# Altium footprint library SMD Component.PcbLib: 163 footprints (part 6 of 11)
Each footprint in its own frame and in the unit in brackets; x right, y up, seen from the top. Pads: shape width x height; smd on the part's side, far side on the other; paste and mask are expansions set on the pad; w line width, h text height; cw(c..) or ccw(c..) is an arc to the next point about the centre after c.
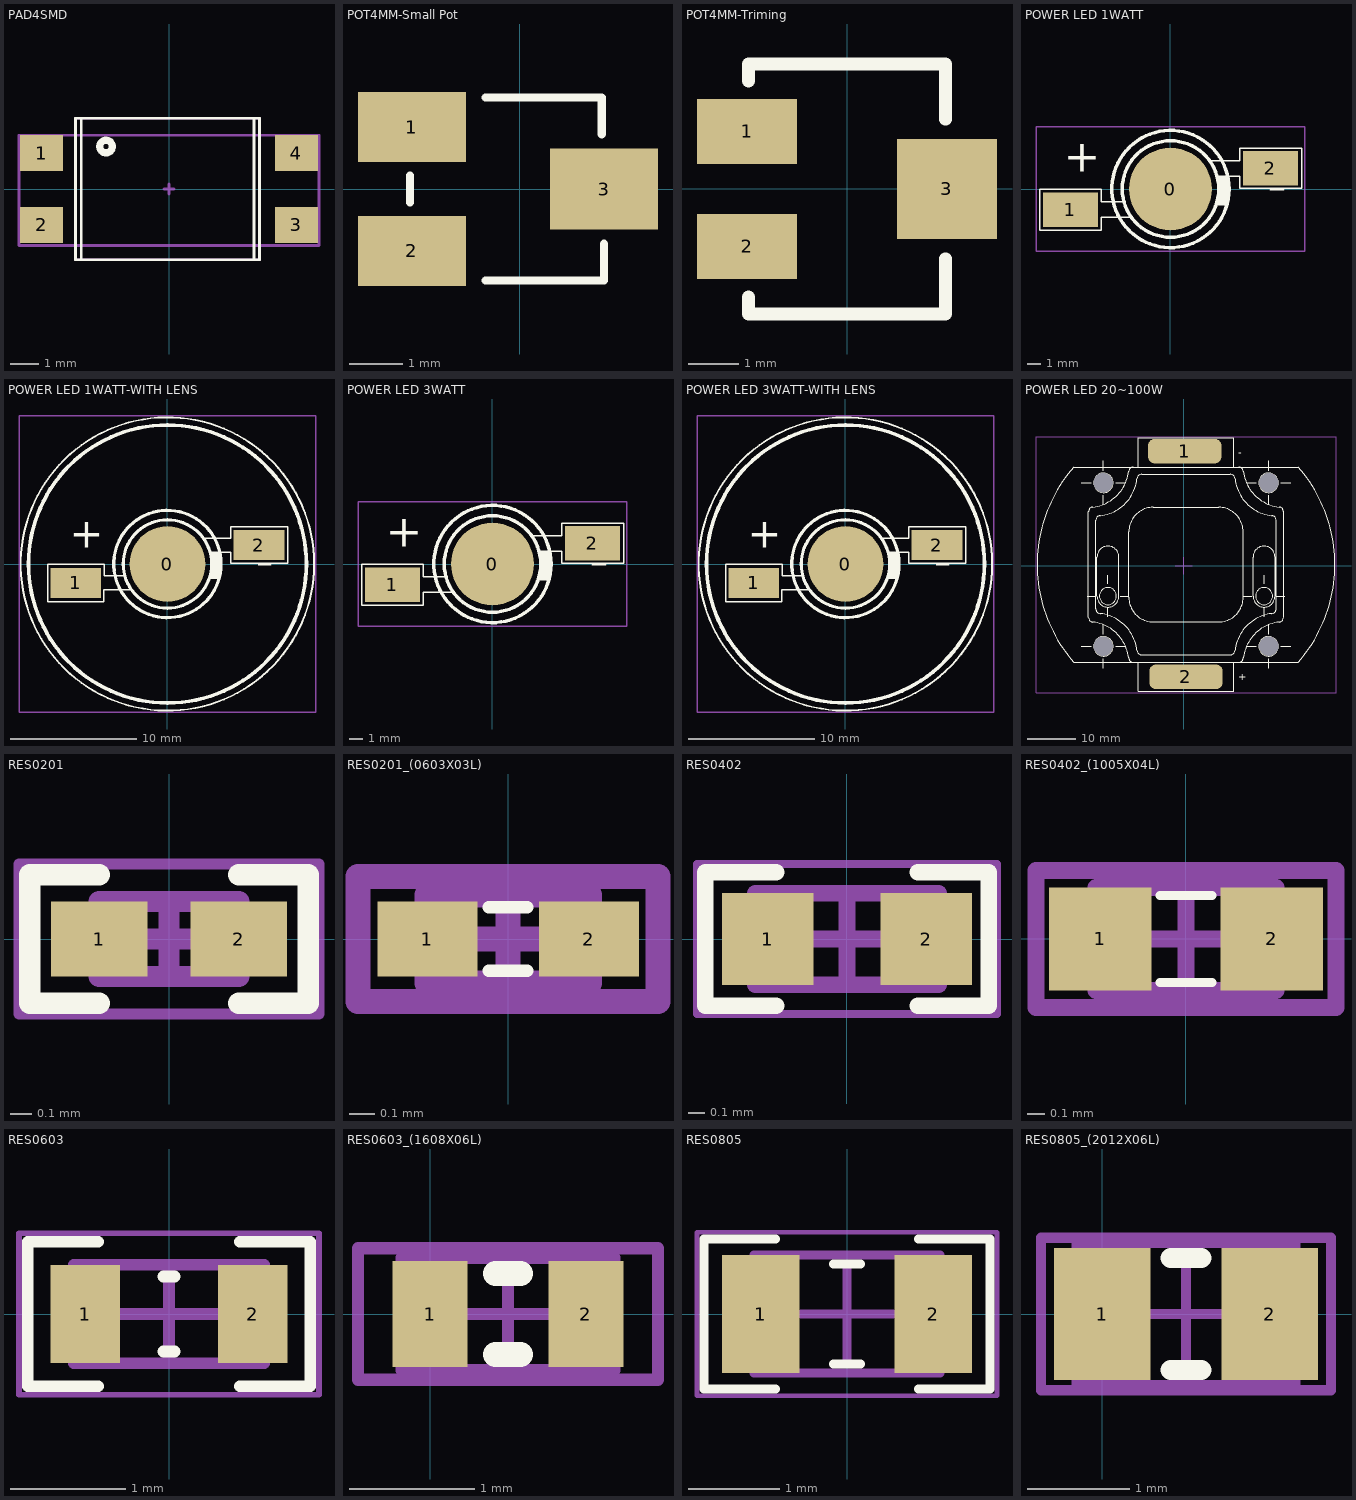
[diagram p5: the footprints below, top view; thin cyan lines are the x and y axes]

## PAD4SMD [mm]
pads (4):
  rect 1.524x1.27 smd: 1(-4.5,1.27) 2(-4.5,-1.27) 3(4.5,-1.27) 4(4.5,1.27)
Top Overlay:
  circle w0.254: c-2.224,1.5 r0.224
  lines w0.1: -3.1,-2.5 -3.1,2.5 ; 3,-2.5 3,2.5 ; -3.3,-2.5 -3.3,2.5 3.2,2.5 3.2,-2.5 -3.3,-2.5
Mechanical 13:
  lines w0.1: -3.3,2.5 -3.3,-2.5 3.2,-2.5 3.2,2.5 -3.25,2.5
Mechanical 15:
  lines w0.1: -0.175,0 0.175,0 ; 0,-0.175 0,0.175 ; -5.3,-2 5.3,-2 5.3,1.9 -5.3,1.9 -5.3,-2
3D body: height 0.55, standoff 0, extent -3.3,-2.5 3.2,2.5

## POT4MM-Small Pot [mm] "Square Trimming Potentiometer"
pads (3):
  rect 2x1.3 smd: 1(-2,1.15) 2(-2,-1.15)
  rect 2x1.5 smd: 3(1.568,0)
Top Overlay:
  lines w0.15: -2.032,-0.254 -2.032,0.254 ; -0.635,-1.7 1.568,-1.7 1.568,-1.016 ; -0.635,1.7 1.524,1.7 1.524,1.016
3D body "TRIMMER_PVG3A.STEP": height 2, standoff 0, extent -2.032,-1.7 1.568,1.7

## POT4MM-Triming [mm] "Square Trimming Potentiometer"
pads (3):
  rect 2x1.3 smd: 1(-2,1.15) 2(-2,-1.15)
  rect 2x2 smd: 3(2,0)
Top Overlay:
  lines w0.254: -1.97,-2.159 -1.97,-2.5 1.97,-2.5 1.97,-1.397 ; -1.97,2.159 -1.97,2.5 1.97,2.5 1.97,1.397
3D body "SW3dPS-Pot 3214.STEP": height 5.4, standoff 0, extent -1.97,-2.4 1.97,2.4

## POWER LED 1WATT [mm] "DESIGNER : ABBAS BASEREH"
height 6
pads (3):
  round 6 smd: 0(0,0)
  rect 4x2.5 smd: 1(-7.25,-1.5) 2(7.25,1.5)
Top Overlay:
  circle w0.254: c0,0 r4.25
  circle w0.254: c0,0 r3.5
  rectangle: 3.405,-1.185 4.185,0.93
  lines w0.1: -3.315,-0.915 -5.01,-0.915 -5.01,-0.015 -9.465,-0.015 -9.465,-1.335 -9.465,-2.985 -5.025,-2.985 -5.025,-2.055 -2.88,-2.055 ; 2.64,2.31 2.91,2.04 5.01,2.04 5.01,2.94 9.06,2.94 9.51,2.94 9.51,0.72 9.51,0.06 5.01,0.06 5.01,0.93 3.45,0.93 3.45,0.675
  text "-" at 7,-2 h5
  text "+" at -7.75,0.5 h4
Mechanical 15:
  lines w0.1: -0.5,0 0.5,0 ; 0,-0.5 0,0.5 ; -9.75,-4.5 9.75,-4.5 9.75,4.5 -9.75,4.5 -9.75,-4.5
3D body "SW3dPS-Power LED2.STEP": height 5.55, standoff 0, extent -7.25,-4 7.25,4

## POWER LED 1WATT-WITH LENS [mm] "DESIGNER : ABBAS BASEREH"
height 13
pads (3):
  round 6 smd: 0(0,0)
  rect 4x2.4 smd: 1(-7.25,-1.5) 2(7.25,1.5)
Top Overlay:
  circle w0.15: c0,0 r11.613
  circle w0.254: c0,0 r4.25
  circle w0.254: c0,0 r3.5
  circle w0.3: c0,0 r11
  rectangle: 3.405,-1.185 4.185,0.93
  lines w0.1: -3.315,-0.915 -5.01,-0.915 -5.01,-0.015 -9.465,-0.015 -9.465,-1.335 -9.465,-2.985 -5.025,-2.985 -5.025,-2.055 -2.88,-2.055 ; 2.64,2.31 2.91,2.04 5.01,2.04 5.01,2.94 9.06,2.94 9.51,2.94 9.51,0.72 9.51,0.06 5.01,0.06 5.01,0.93 3.45,0.93 3.45,0.675
  text "-" at 7,-2 h5
  text "+" at -7.75,0.5 h4
Mechanical 15:
  lines w0.1: -0.75,0 0.75,0 ; 0,-0.75 0,0.75 ; -11.75,-11.75 11.75,-11.75 11.75,11.75 -11.75,11.75 -11.75,-11.75
3D body: height 13, standoff 0, extent -11,-11 11,11.1
3D body "User Library-FL-36.STEP": height 14, standoff -0.15, extent -9.697,-9.75 9.697,9.85
3D body "SW3dPS-Power LED2.STEP": height 5.55, standoff 0, extent -7.25,-4 7.25,4

## POWER LED 3WATT [mm] "DESIGNER : ABBAS BASEREH"
height 6
pads (3):
  round 6 smd: 0(0,0)
  rect 4x2.5 smd: 1(-7.25,-1.5) 2(7.25,1.5)
Top Overlay:
  circle w0.254: c0,0 r3.5
  circle w0.254: c0,0 r4.25
  rectangle: 3.405,-1.185 4.185,0.93
  lines w0.1: -3.315,-0.915 -5.01,-0.915 -5.01,-0.015 -9.465,-0.015 -9.465,-1.335 -9.465,-2.985 -5.025,-2.985 -5.025,-2.055 -2.88,-2.055 ; 2.64,2.31 2.91,2.04 5.01,2.04 5.01,2.94 9.06,2.94 9.51,2.94 9.51,0.72 9.51,0.06 5.01,0.06 5.01,0.93 3.45,0.93 3.45,0.675
  text "+" at -7.75,0.5 h4
  text "-" at 7,-2 h5
Mechanical 15:
  lines w0.1: -0.5,0 0.5,0 ; 0,-0.5 0,0.5 ; -9.75,-4.5 -9.75,4.5 9.75,4.5 9.75,-4.5 -9.75,-4.5
3D body "User Library-zled_p4-1.STEP": height 5.2, standoff 0, extent -7.25,-4 7.25,4

## POWER LED 3WATT-WITH LENS [mm] "DESIGNER : ABBAS BASEREH"
height 13
pads (3):
  round 6 smd: 0(0,0)
  rect 4x2.4 smd: 1(-7.25,-1.5) 2(7.25,1.5)
Top Overlay:
  circle w0.3: c0,0 r11
  circle w0.254: c0,0 r3.5
  circle w0.254: c0,0 r4.25
  circle w0.15: c0,0 r11.613
  rectangle: 3.405,-1.185 4.185,0.93
  lines w0.1: -3.315,-0.915 -5.01,-0.915 -5.01,-0.015 -9.465,-0.015 -9.465,-1.335 -9.465,-2.985 -5.025,-2.985 -5.025,-2.055 -2.88,-2.055 ; 2.64,2.31 2.91,2.04 5.01,2.04 5.01,2.94 9.06,2.94 9.51,2.94 9.51,0.72 9.51,0.06 5.01,0.06 5.01,0.93 3.45,0.93 3.45,0.675
  text "+" at -7.75,0.5 h4
  text "-" at 7,-2 h5
Mechanical 15:
  lines w0.1: -0.75,0 0.75,0 ; 0,-0.75 0,0.75 ; -11.75,-11.75 -11.75,11.75 11.75,11.75 11.75,-11.75 -11.75,-11.75
3D body "User Library-zled_p4-1.STEP": height 5.2, standoff 0, extent -7.25,-4 7.25,4
3D body "User Library-FL-36.STEP": height 14, standoff -0.15, extent -9.697,-9.75 9.697,9.85
3D body: height 13, standoff 0, extent -11,-11 11,11.1

## POWER LED 20~100W [mm] "DESIGNER ABBAS BASEREH"
height 5
pads (6):
  rrect50% 15x5 smd: 1(0.25,23.5) 2(0.5,-22.75)
  round 4 hole 4: SCREW(-16.431,-16.508) SCREW(-16.431,17.008) SCREW(17.431,-16.508) SCREW(17.431,17.008)
Top Overlay:
  circle w0.013: c16.5,-6.197 r1.75
  circle w0.013: c-15.5,-6.197 r1.75
  circle w0.013: c-4.442,23.25 r1
  circle w0.013: c0.5,23.25 r1
  circle w0.013: c5.558,23.25 r1
  circle w0.013: c0.5,-22.75 r1
  circle w0.013: c5.5,-22.75 r1
  circle w0.013: c-4.5,-22.75 r1
  circle w0.013: c17.431,17.008 r2
  circle w0.013: c17.431,-16.508 r2
  circle w0.013: c-16.431,17.008 r2
  circle w0.013: c-16.431,-16.508 r2
  lines w0.013: -20.931,-16.508 -18.931,-16.508 ; -20.931,17.008 -18.931,17.008 ; -19.75,-6.197 -18,-6.197 ; -16.431,-21.008 -16.431,-19.008 ; -16.431,-14.008 -16.431,-12.008 ; -16.431,12.508 -16.431,14.508 ; -16.431,19.508 -16.431,21.508 ; -15.5,-10.447 -15.5,-8.697 ; -15.5,-3.697 -15.5,-1.947 ; -13.931,-16.508 -11.931,-16.508 ; -13.931,17.008 -11.931,17.008 ; -13,-6.197 -11.25,-6.197 ; -9.275,-19.75 -9.275,-25.75 10.275,-25.75 10.275,-19.75 ; -9.275,20.25 -9.275,26.25 10.275,26.25 10.275,20.25 ; 12.25,-6.197 14,-6.197 ; 12.931,-16.508 14.931,-16.508 ; 12.931,17.008 14.931,17.008 ; 16.5,-10.447 16.5,-8.697 ; 16.5,-3.697 16.5,-1.947 ; 17.431,-21.008 17.431,-19.008 ; 17.431,-14.008 17.431,-12.008 ; 17.431,12.508 17.431,14.508 ; 17.431,19.508 17.431,21.508 ; 19,-6.197 20.75,-6.197 ; 19.931,-16.508 21.931,-16.508 ; 19.931,17.008 21.931,17.008 ; -10.275,-19.75 cw(c-10.275,-18.75) -11.269,-18.861 ccw(c-19.5,-19.777) -18.608,-11.544 cw(c-18.5,-10.549) -19.5,-10.549 -19.5,11.049 cw(c-18.5,11.049) -18.608,12.044 ccw(c-19.5,20.277) -11.269,19.361 cw(c-10.275,19.25) -10.275,20.25 ; -10.275,-19.75 11.275,-19.75 ; -10.275,-19.75 -22.535,-19.75 cw(c0.5,0.25) -22.535,20.25 -10.275,20.25 ; -10.275,20.25 11.275,20.25 ; 11.275,-19.75 ccw(c11.275,-18.75) 12.269,-18.861 cw(c20.5,-19.777) 19.608,-11.544 ccw(c19.5,-10.549) 20.5,-10.549 20.5,11.049 ccw(c19.5,11.049) 19.608,12.044 cw(c20.5,20.277) 12.269,19.361 ccw(c11.275,19.25) 11.275,20.25 ; 11.275,-19.75 23.535,-19.75 ccw(c0.5,0.25) 23.535,20.25 11.275,20.25 ; -18,-8.803 ccw(c-17,-8.803) -17.105,-9.797 cw(c-18,-18.25) -9.547,-17.355 ccw(c-8.553,-17.25) -8.553,-18.25 9.553,-18.25 ccw(c9.553,-17.25) 10.547,-17.355 cw(c19,-18.25) 18.105,-9.797 ccw(c18,-8.803) 19,-8.803 19,9.303 ccw(c18,9.303) 18.105,10.297 cw(c19,18.75) 10.547,17.855 ccw(c9.553,17.75) 9.553,18.75 -8.553,18.75 ccw(c-8.553,17.75) -9.547,17.855 cw(c-18,18.75) -17.105,10.297 ccw(c-17,9.303) -18,9.303 -18,-8.803 ; -17.75,-6.197 ccw(c-15.5,-6.197) -13.25,-6.197 -13.25,1.803 ccw(c-15.5,1.803) -17.75,1.803 -17.75,-6.197 ; -11.218,-6.495 ccw(c-6.218,-6.495) -6.218,-11.495 7.218,-11.495 ccw(c7.218,-6.495) 12.218,-6.495 12.218,6.995 ccw(c7.218,6.995) 7.218,11.995 -6.218,11.995 ccw(c-6.218,6.995) -11.218,6.995 -11.218,-6.495 ; 14.25,-6.197 ccw(c16.5,-6.197) 18.75,-6.197 18.75,1.803 ccw(c16.5,1.803) 14.25,1.803 14.25,-6.197
  text "+" at 11.25,-23.5 h1.52
  text "-" at 11.25,22.5 h1.52
Mechanical 15:
  lines w0.1: -1.75,0 1.75,0 ; 0,-1.75 0,1.75 ; -30.25,-26 31.25,-26 31.25,26.5 -30.25,26.5 -30.25,-26
3D body "APPLICATION LED-50w - 100w.STEP": height 4.4, standoff 0, extent -30.006,-25.75 31.006,26.25

## RES0201 [mm] "Chip Resistor, 2-Leads, Body 0/60x0/30mm, IPC Medium Density DESIGNER:ABBAS BASEREH"
height 0.23
pads (2):
  rect 0.45x0.35 smd mask+0.04: 1(-0.325,0) 2(0.325,0)
Top Overlay:
  lines w0.1: -0.325,-0.3 -0.65,-0.3 -0.65,0.3 -0.325,0.3 ; 0.325,-0.3 0.65,-0.3 0.65,0.3 0.325,0.3
Mechanical 13:
  lines w0.1: -0.325,-0.175 -0.325,0.175 0.325,0.175 0.325,-0.175 -0.325,-0.175
Mechanical 15:
  lines w0.05: -0.7,-0.35 -0.7,0.35 0.7,0.35 0.7,-0.35 -0.7,-0.35
  lines w0.1: -0.175,0 0.175,0 ; 0,-0.175 0,0.175
3D body "RES0201.step": height 0.23, standoff 0, extent -0.325,-0.175 0.325,0.175

## RES0201_(0603X03L) [mm] "Chip Resistor, 2-Leads, Body 0.6x0.3mm, IPC High Density (0.05 W)"
height 0.3
pads (2):
  rect 0.4x0.3 smd: 1(-0.323,0) 2(0.323,0)
Top Overlay:
  lines w0.051: -0.076,-0.127 0.076,-0.127 ; -0.076,0.127 0.076,0.127
Mechanical 13:
  lines w0.1: -0.325,-0.175 0.325,-0.175 0.325,0.175 -0.325,0.175 -0.325,-0.175
Mechanical 15:
  lines w0.1: -0.175,0 0.175,0 ; 0,-0.175 0,0.175 ; -0.6,-0.25 0.6,-0.25 0.6,0.25 -0.6,0.25 -0.6,-0.25
3D body "0201.STEP": height 0.25, standoff 0, extent -0.254,-0.127 0.254,0.127

## RES0402 [mm] "Chip Resistor, 2-Leads, Body 1/00x0/50mm, IPC Medium Density DESIGNER:ABBAS BASEREH"
height 0.32
pads (2):
  rect 0.55x0.55 smd mask+0.06: 1(-0.475,0) 2(0.475,0)
Top Overlay:
  lines w0.1: -0.425,-0.4 -0.85,-0.4 -0.85,0.4 -0.425,0.4 ; 0.425,-0.4 0.85,-0.4 0.85,0.4 0.425,0.4
Mechanical 13:
  lines w0.1: -0.55,-0.275 0.55,-0.275 0.55,0.275 -0.55,0.275 -0.55,-0.275
Mechanical 15:
  lines w0.05: -0.9,-0.45 0.9,-0.45 0.9,0.45 -0.9,0.45 -0.9,-0.45
  lines w0.1: -0.275,0 0.275,0 ; 0,-0.275 0,0.275
3D body "RES0402.step": height 0.32, standoff 0, extent -0.55,-0.275 0.55,0.275

## RES0402_(1005X04L) [mm] "Chip Resistor, 2-Leads, Body 1.0x0.5mm, IPC High Density _ (0.031/0.063 W)"
height 0.4
pads (2):
  rect 0.6x0.6 smd: 1(-0.5,0) 2(0.5,0)
Top Overlay:
  lines w0.051: -0.152,-0.254 0.152,-0.254 ; -0.152,0.254 0.152,0.254
Mechanical 13:
  lines w0.1: -0.525,-0.3 -0.525,0.3 0.525,0.3 0.525,-0.3 -0.525,-0.3
Mechanical 15:
  lines w0.1: -0.3,0 0.3,0 ; 0,-0.3 0,0.3 ; -0.875,-0.4 -0.875,0.4 0.875,0.4 0.875,-0.4 -0.875,-0.4
3D body "0402.STEP": height 0.35, standoff 0, extent -0.508,-0.254 0.508,0.254

## RES0603 [mm] "Chip Resistor, 2-Leads, Body 1/60x0/80mm, IPC Medium Density DESIGNER:ABBAS BASEREH"
height 0.4
pads (2):
  rect 0.6x0.85 smd: 1(-0.725,0) 2(0.725,0)
Top Overlay:
  lines w0.1: -0.613,-0.625 -1.225,-0.625 -1.225,0.625 -0.613,0.625 ; -0.05,-0.325 0.05,-0.325 ; -0.05,0.325 0.05,0.325 ; 0.613,-0.625 1.225,-0.625 1.225,0.625 0.613,0.625
Mechanical 13:
  lines w0.1: -0.825,-0.425 0.825,-0.425 0.825,0.425 -0.825,0.425 -0.825,-0.425
Mechanical 15:
  lines w0.05: -1.3,-0.7 1.3,-0.7 1.3,0.7 -1.3,0.7 -1.3,-0.7
  lines w0.1: -0.425,0 0.425,0 ; 0,-0.425 0,0.425

## RES0603_(1608X06L) [mm] "Chip Resistor, 2-Leads, Body 1.6x0.8mm, IPC High Density _ (0.063W)"
height 0.6
pads (2):
  rect 0.6x0.85 smd: 1(0,0) 2(1.244,0)
Top Overlay:
  lines w0.2: 0.522,-0.325 0.722,-0.325 ; 0.522,0.325 0.722,0.325
Mechanical 13:
  lines w0.1: -0.228,-0.45 1.472,-0.45 1.472,0.45 -0.228,0.45 -0.228,-0.45
Mechanical 15:
  lines w0.1: 0.172,0 1.072,0 ; 0.622,-0.45 0.622,0.45 ; -0.578,-0.525 1.822,-0.525 1.822,0.525 -0.578,0.525 -0.578,-0.525
3D body "0603.STEP": height 0.45, standoff 0, extent -0.14,-0.381 1.384,0.381

## RES0805 [mm] "Chip Resistor, 2-Leads, Body 2/00x1/25mm, IPC Medium Density DESIGNER:ABBAS BASEREH"
height 0.5
pads (2):
  rect 0.85x1.3 smd: 1(-0.95,0) 2(0.95,0)
Top Overlay:
  lines w0.1: -0.788,-0.825 -1.575,-0.825 -1.575,0.825 -0.788,0.825 ; -0.15,-0.55 0.15,-0.55 ; -0.15,0.55 0.15,0.55 ; 0.788,-0.825 1.575,-0.825 1.575,0.825 0.788,0.825
Mechanical 13:
  lines w0.1: -1.025,-0.65 1.025,-0.65 1.025,0.65 -1.025,0.65 -1.025,-0.65
Mechanical 15:
  lines w0.05: -1.65,-0.9 1.65,-0.9 1.65,0.9 -1.65,0.9 -1.65,-0.9
  lines w0.1: -0.5,0 0.5,0 ; 0,-0.5 0,0.5
3D body "RES0805.step": height 0.5, standoff 0, extent -1.025,-0.65 1.025,0.65

## RES0805_(2012X06L) [mm] "Chip Resistor, 2-Leads, Body 2.0x1.3mm, IPC High Density _ (0.100 W)"
height 0.65
pads (2):
  rect 0.95x1.3 smd: 1(0,0) 2(1.65,0)
Top Overlay:
  lines w0.2: 0.675,-0.55 0.975,-0.55 ; 0.675,0.55 0.975,0.55
Mechanical 13:
  lines w0.1: -0.25,-0.7 -0.25,0.7 1.9,0.7 1.9,-0.7 -0.25,-0.7
Mechanical 15:
  lines w0.1: 0.325,0 1.325,0 ; 0.825,-0.5 0.825,0.5 ; -0.6,-0.75 -0.6,0.75 2.25,0.75 2.25,-0.75 -0.6,-0.75
3D body "0805.STEP": height 0.6, standoff 0, extent -0.191,-0.635 1.841,0.635